# Altium footprint library connecteurs.PcbLib: 162 footprints (part 5 of 11)
Each footprint in its own frame and in the unit in brackets; x right, y up, seen from the top. Pads: shape width x height; smd on the part's side, far side on the other; paste and mask are expansions set on the pad; w line width, h text height; cw(c..) or ccw(c..) is an arc to the next point about the centre after c.
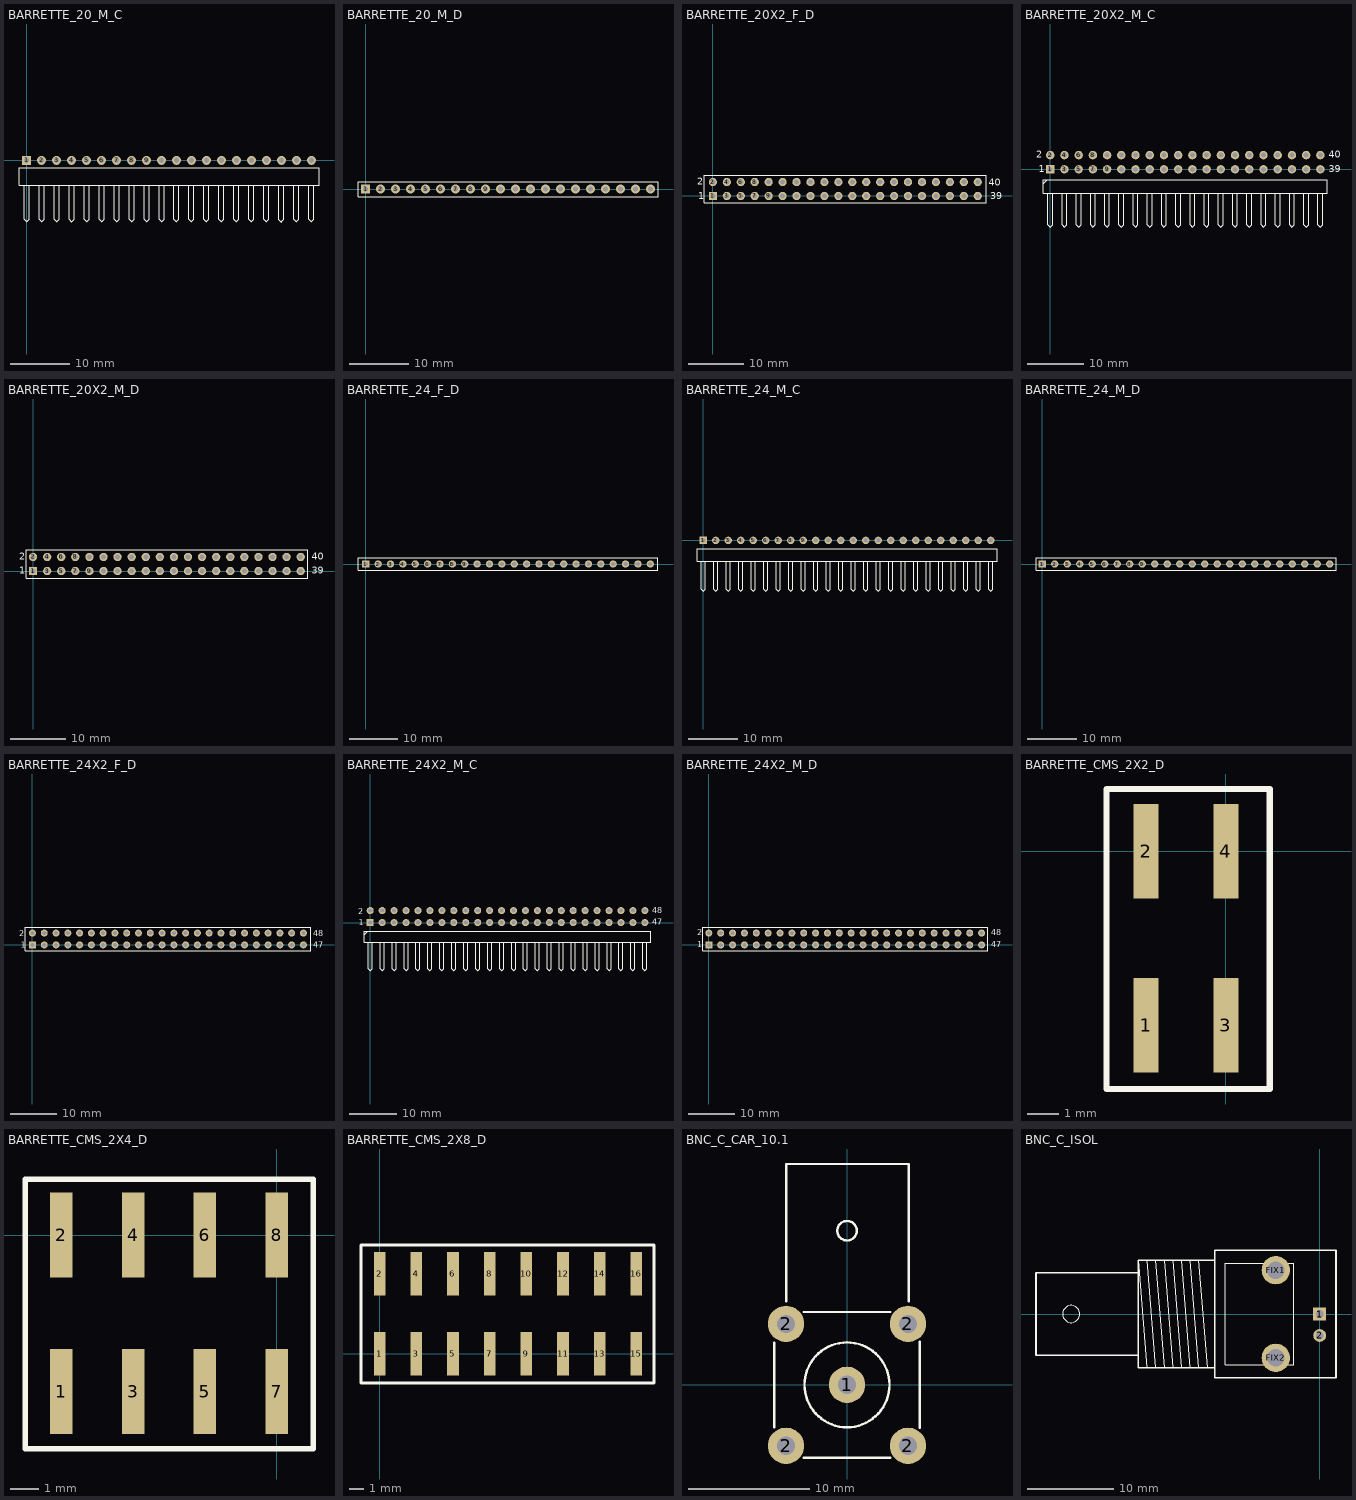
[diagram p4: the footprints below, top view; thin cyan lines are the x and y axes]

## BARRETTE_20_M_C [mm] "BARRETTE 20 CONTACTS ; 1 RANGEE ; COUDEE ; MALE ; ESPACEMENT BROCHES = 2.54 mm"
height 2.5
pads (20):
  rect 1.5x1.5 hole 0.9: 1(0,0)
  round 1.5 hole 0.9: 2(2.54,0) 3(5.08,0) 4(7.62,0) 5(10.16,0) 6(12.7,0) 7(15.24,0) 8(17.78,0) 9(20.32,0) 10(22.86,0) 11(25.4,0) 12(27.94,0) 13(30.48,0) 14(33.02,0) 15(35.56,0) 16(38.1,0) 17(40.64,0) 18(43.18,0) 19(45.72,0) 20(48.26,0)
Top Overlay:
  lines w0.2: -0.423,-4.19 -0.423,-10 0,-10.423 0.423,-10 0.423,-4.19 ; 2.117,-4.19 2.117,-9.99 2.54,-10.413 ; 2.54,-10.423 2.963,-10 2.963,-4.19 ; 4.657,-4.19 4.657,-10 5.08,-10.423 5.503,-10 5.503,-4.19 ; 7.197,-4.19 7.197,-10 7.62,-10.423 8.043,-10 8.043,-4.19 ; 9.737,-4.19 9.737,-10 10.16,-10.423 10.583,-10 10.583,-4.19 ; 12.277,-4.19 12.277,-10 12.7,-10.423 13.123,-10 13.123,-4.19 ; 14.817,-4.19 14.817,-10 15.24,-10.423 15.663,-10 15.663,-4.19 ; 17.357,-4.19 17.357,-10 17.78,-10.423 18.203,-10 18.203,-4.19 ; 19.897,-4.19 19.897,-10 20.32,-10.423 20.743,-10 20.743,-4.19 ; 22.437,-4.19 22.437,-10 22.86,-10.423 23.283,-10 23.283,-4.19 ; 24.977,-4.19 24.977,-10 25.4,-10.423 25.823,-10 25.823,-4.19 ; 27.517,-4.19 27.517,-10 27.94,-10.423 28.363,-10 28.363,-4.19 ; 30.057,-4.19 30.057,-10 30.48,-10.423 30.903,-10 30.903,-4.19 ; 32.597,-4.19 32.597,-10 33.02,-10.423 33.443,-10 33.443,-4.19 ; 35.137,-4.19 35.137,-10 35.56,-10.423 35.983,-10 35.983,-4.19 ; 37.677,-4.19 37.677,-10 38.1,-10.423 38.523,-10 38.523,-4.19 ; 40.217,-4.19 40.217,-10 40.64,-10.423 41.063,-10 41.063,-4.19 ; 42.757,-4.19 42.757,-10.01 43.18,-10.433 ; 43.18,-10.423 43.603,-10 43.603,-4.19 ; 45.297,-4.19 45.297,-10 45.72,-10.423 46.143,-10 46.143,-4.19 ; 47.837,-4.19 47.837,-10 48.26,-10.423 48.683,-10 48.683,-4.19 ; -1.27,-4.19 -1.27,-1.27 0.635,-1.27 49.53,-1.27 49.53,-4.19 -1.27,-4.19
3D body: height 2.55, standoff -1.95, extent -1.24,-10 11.46,0.32
3D body: height 2.55, standoff -1.95, extent 11.46,-10 24.16,0.32
3D body: height 2.55, standoff -1.95, extent 24.16,-10 36.86,0.32
3D body: height 2.55, standoff -1.95, extent 36.86,-10 49.56,0.32

## BARRETTE_20_M_D [mm] "BARRETTE 20 CONTACTS ; 1 RANGEE ; DROITE ; MALE ; ESPACEMENT BROCHES = 2.54 mm"
height 9.6
pads (20):
  rect 1.5x1.5 hole 0.9: 1(0,0)
  round 1.5 hole 0.9: 2(2.54,0) 3(5.08,0) 4(7.62,0) 5(10.16,0) 6(12.7,0) 7(15.24,0) 8(17.78,0) 9(20.32,0) 10(22.86,0) 11(25.4,0) 12(27.94,0) 13(30.48,0) 14(33.02,0) 15(35.56,0) 16(38.1,0) 17(40.64,0) 18(43.18,0) 19(45.72,0) 20(48.26,0)
Top Overlay:
  lines w0.2: -1.27,-1.27 -1.27,1.27 0.635,1.27 49.53,1.27 49.53,-1.27 -1.27,-1.27
3D body: height 10.1, standoff -1.5, extent -1.3,-1.27 49.5,1.27

## BARRETTE_20X2_F_D [mm] "BARRETTE 20 CONTACTS ; 2 RANGEES ; DROITE ; FEMELLE ; ESPACEMENT BROCHES = 2.54 mm"
height 8.6
pads (40):
  rect 1.5x1.5 hole 0.9: 1(0,0)
  round 1.5 hole 0.9: 2(0,2.54) 3(2.54,0) 4(2.54,2.54) 5(5.08,0) 6(5.08,2.54) 7(7.62,0) 8(7.62,2.54) 9(10.16,0) 10(10.16,2.54) 11(12.7,0) 12(12.7,2.54) 13(15.24,0) 14(15.24,2.54) 15(17.78,0) 16(17.78,2.54) 17(20.32,0) 18(20.32,2.54) 19(22.86,0) 20(22.86,2.54) 21(25.4,0) 22(25.4,2.54) 23(27.94,0) 24(27.94,2.54) 25(30.48,0) 26(30.48,2.54) 27(33.02,0) 28(33.02,2.54) 29(35.56,0) 30(35.56,2.54) 31(38.1,0) 32(38.1,2.54) 33(40.64,0) 34(40.64,2.54) 35(43.18,0) 36(43.18,2.54) 37(45.72,0) 38(45.72,2.54) 39(48.26,0) 40(48.26,2.54)
Top Overlay:
  lines w0.2: -1.6,-1.27 49.8,-1.27 49.8,3.81 -1.6,3.81 -1.6,-1.27
  text "1" at -2.7,-0.6 h1.27
  text "2" at -2.9,2 h1.27
  text "40" at 50.3,1.9 h1.27
  text "39" at 50.5,-0.6 h1.27
3D body: height 8.5, standoff -2.65, extent -1.554,-1.2 49.754,3.753

## BARRETTE_20X2_M_C [mm] "BARRETTE 20 CONTACTS ; 2 RANGEES ; COUDEE ; MALE ; ESPACEMENT BROCHES = 2.54 mm"
height 5
pads (40):
  rect 1.5x1.5 hole 0.9: 1(0,0)
  round 1.5 hole 0.9: 2(0,2.54) 3(2.54,0) 4(2.54,2.54) 5(5.08,0) 6(5.08,2.54) 7(7.62,0) 8(7.62,2.54) 9(10.16,0) 10(10.16,2.54) 11(12.7,0) 12(12.7,2.54) 13(15.24,0) 14(15.24,2.54) 15(17.78,0) 16(17.78,2.54) 17(20.32,0) 18(20.32,2.54) 19(22.86,0) 20(22.86,2.54) 21(25.4,0) 22(25.4,2.54) 23(27.94,0) 24(27.94,2.54) 25(30.48,0) 26(30.48,2.54) 27(33.02,0) 28(33.02,2.54) 29(35.56,0) 30(35.56,2.54) 31(38.1,0) 32(38.1,2.54) 33(40.64,0) 34(40.64,2.54) 35(43.18,0) 36(43.18,2.54) 37(45.72,0) 38(45.72,2.54) 39(48.26,0) 40(48.26,2.54)
Top Overlay:
  lines w0.2: -1.27,-2.605 -0.635,-1.97 ; -0.423,-4.3 -0.423,-9.9 0,-10.323 0.423,-9.9 0.423,-4.4 ; 2.117,-4.3 2.117,-9.9 2.54,-10.323 2.963,-9.9 2.963,-4.3 ; 4.657,-4.3 4.657,-9.9 5.08,-10.323 5.503,-9.9 5.503,-4.3 ; 7.197,-4.3 7.197,-9.9 7.62,-10.323 8.043,-9.9 8.043,-4.3 ; 9.737,-4.4 9.737,-9.9 10.16,-10.323 10.583,-9.9 10.583,-4.3 ; 12.277,-4.3 12.277,-9.9 12.7,-10.323 13.123,-9.9 13.123,-4.3 ; 14.817,-4.3 14.817,-9.9 15.24,-10.323 15.663,-9.9 15.663,-4.3 ; 17.357,-4.3 17.357,-9.9 17.78,-10.323 18.203,-9.9 18.203,-4.3 ; 19.897,-4.3 19.897,-9.9 20.32,-10.323 20.743,-9.9 20.743,-4.3 ; 22.437,-4.3 22.437,-9.9 22.86,-10.323 23.283,-9.9 23.283,-4.3 ; 24.977,-4.3 24.977,-9.9 25.4,-10.323 25.823,-9.9 25.823,-4.3 ; 27.517,-4.3 27.517,-9.9 27.94,-10.323 28.363,-9.9 28.363,-4.3 ; 30.057,-4.3 30.057,-9.9 30.48,-10.323 30.903,-9.9 30.903,-4.3 ; 32.597,-4.3 32.597,-9.9 33.02,-10.323 33.443,-9.9 33.443,-4.3 ; 35.137,-4.3 35.137,-9.9 35.56,-10.323 35.983,-9.9 35.983,-4.3 ; 37.677,-4.4 37.677,-9.9 38.1,-10.323 38.523,-9.9 38.523,-4.3 ; 40.217,-4.3 40.217,-9.9 40.64,-10.323 41.063,-9.9 41.063,-4.3 ; 42.757,-4.3 42.757,-9.9 43.18,-10.323 43.603,-9.9 43.603,-4.3 ; 45.297,-4.3 45.297,-9.9 45.72,-10.323 46.143,-9.9 46.143,-4.3 ; 47.837,-4.3 47.837,-9.9 48.26,-10.323 48.683,-9.9 48.683,-4.3 ; -1.27,-4.3 49.53,-4.3 49.53,-1.9 -1.27,-1.9 -1.27,-4.3
  text "2" at -2.54,2.032 h1.27
  text "1" at -2.032,-0.508 h1.27
  text "39" at 49.784,-0.508 h1.27
  text "40" at 49.784,2.032 h1.27
3D body: height 5.64, standoff -2.23, extent -1.3,-9.9 49.5,2.863

## BARRETTE_20X2_M_D [mm] "BARRETTE 20 CONTACTS ; 2 RANGEES ; DROITE ; MALE ; ESPACEMENT BROCHES = 2.54 mm"
height 9.6
pads (40):
  rect 1.5x1.5 hole 0.9: 1(0,0)
  round 1.5 hole 0.9: 2(0,2.54) 3(2.54,0) 4(2.54,2.54) 5(5.08,0) 6(5.08,2.54) 7(7.62,0) 8(7.62,2.54) 9(10.16,0) 10(10.16,2.54) 11(12.7,0) 12(12.7,2.54) 13(15.24,0) 14(15.24,2.54) 15(17.78,0) 16(17.78,2.54) 17(20.32,0) 18(20.32,2.54) 19(22.86,0) 20(22.86,2.54) 21(25.4,0) 22(25.4,2.54) 23(27.94,0) 24(27.94,2.54) 25(30.48,0) 26(30.48,2.54) 27(33.02,0) 28(33.02,2.54) 29(35.56,0) 30(35.56,2.54) 31(38.1,0) 32(38.1,2.54) 33(40.64,0) 34(40.64,2.54) 35(43.18,0) 36(43.18,2.54) 37(45.72,0) 38(45.72,2.54) 39(48.26,0) 40(48.26,2.54)
Top Overlay:
  lines w0.2: -1.27,-1.27 -1.27,3.81 49.53,3.81 49.53,-1.27 -1.27,-1.27
  text "39" at 50.292,-0.508 h1.27
  text "40" at 50.292,2.032 h1.27
  text "2" at -2.54,2.032 h1.27
  text "1" at -2.54,-0.508 h1.27
3D body: height 10.67, standoff -2.79, extent -1.3,-1.24 49.5,3.84

## BARRETTE_24_F_D [mm] "BARRETTE 24 CONTACTS ; 1 RANGEE ; DROITE ; FEMELLE ; ESPACEMENT BROCHES = 2.54 mm"
height 8.6
pads (24):
  rect 1.5x1.5 hole 0.9: 1(0,0)
  round 1.5 hole 0.9: 2(2.54,0) 3(5.08,0) 4(7.62,0) 5(10.16,0) 6(12.7,0) 7(15.24,0) 8(17.78,0) 9(20.32,0) 10(22.86,0) 11(25.4,0) 12(27.94,0) 13(30.48,0) 14(33.02,0) 15(35.56,0) 16(38.1,0) 17(40.64,0) 18(43.18,0) 19(45.72,0) 20(48.26,0) 21(50.8,0) 22(53.34,0) 23(55.88,0) 24(58.42,0)
Top Overlay:
  lines w0.2: -1.6,-1.27 60,-1.27 60,1.27 0.635,1.27 -1.6,1.27 -1.6,-1.27
3D body: height 8.5, standoff -2.65, extent -1.534,-1.213 59.934,1.2

## BARRETTE_24_M_C [mm] "BARRETTE 24 CONTACTS ; 1 RANGEE ; COUDEE ; MALE ; ESPACEMENT BROCHES = 2.54 mm"
height 2.5
pads (24):
  rect 1.5x1.5 hole 0.9: 1(0,0)
  round 1.5 hole 0.9: 2(2.54,0) 3(5.08,0) 4(7.62,0) 5(10.16,0) 6(12.7,0) 7(15.24,0) 8(17.78,0) 9(20.32,0) 10(22.86,0) 11(25.4,0) 12(27.94,0) 13(30.48,0) 14(33.02,0) 15(35.56,0) 16(38.1,0) 17(40.64,0) 18(43.18,0) 19(45.72,0) 20(48.26,0) 21(50.8,0) 22(53.34,0) 23(55.88,0) 24(58.42,0)
Top Overlay:
  lines w0.2: -0.423,-4.2 -0.423,-9.92 0,-10.343 0.423,-9.92 0.423,-4.2 ; 2.117,-4.2 2.117,-9.92 2.54,-10.343 2.963,-9.92 2.963,-4.2 ; 4.657,-4.2 4.657,-9.92 5.08,-10.343 ; 5.08,-10.353 5.503,-9.93 5.503,-4.2 ; 7.197,-4.2 7.197,-9.92 7.62,-10.343 8.043,-9.92 8.043,-4.2 ; 9.737,-4.2 9.737,-9.92 10.16,-10.343 10.583,-9.92 10.583,-4.2 ; 12.277,-4.2 12.277,-9.92 12.7,-10.343 13.123,-9.92 13.123,-4.3 ; 14.817,-4.2 14.817,-9.92 15.24,-10.343 15.663,-9.92 15.663,-4.2 ; 17.357,-4.2 17.357,-9.92 17.78,-10.343 18.203,-9.92 18.203,-4.2 ; 19.897,-4.2 19.897,-9.92 20.32,-10.343 20.743,-9.92 20.743,-4.2 ; 22.443,-4.2 22.443,-9.92 22.867,-10.343 ; 22.86,-10.343 23.283,-9.92 23.283,-4.2 ; 24.977,-4.2 24.977,-9.92 25.4,-10.343 25.823,-9.92 25.823,-4.2 ; 27.5,-4.2 27.5,-9.92 27.923,-10.343 ; 27.94,-10.343 28.363,-9.92 28.363,-4.2 ; 30.043,-4.2 30.043,-9.92 30.467,-10.343 ; 30.48,-10.343 30.903,-9.92 30.903,-4.2 ; 32.597,-4.2 32.597,-9.92 33.02,-10.343 33.443,-9.92 33.443,-4.2 ; 35.137,-4.2 35.137,-9.92 35.56,-10.343 35.983,-9.92 35.983,-4.2 ; 37.677,-4.2 37.677,-9.92 38.1,-10.343 38.523,-9.92 38.523,-4.2 ; 40.217,-4.2 40.217,-9.92 40.64,-10.343 41.063,-9.92 41.063,-4.2 ; 42.757,-4.2 42.757,-9.92 43.18,-10.343 43.603,-9.92 43.603,-4.2 ; 45.297,-4.2 45.297,-9.92 45.72,-10.343 46.143,-9.92 46.143,-4.2 ; 47.843,-4.2 47.843,-9.92 48.267,-10.343 ; 48.26,-10.343 48.683,-9.92 48.683,-4.2 ; 50.377,-4.2 50.377,-9.92 50.8,-10.343 51.223,-9.92 51.223,-4.2 ; 52.917,-4.2 52.917,-9.92 53.34,-10.343 53.763,-9.92 53.763,-4.2 ; 55.443,-4.2 55.443,-9.92 55.867,-10.343 ; 55.88,-10.343 56.303,-9.92 56.303,-4.2 ; 58,-4.2 58,-9.92 58.423,-10.343 ; 58.42,-10.343 58.843,-9.92 58.843,-4.2 ; -1.27,-4.2 -1.27,-1.7 1.465,-1.7 59.69,-1.7 59.69,-4.2 -1.27,-4.2
3D body: height 3.07, standoff -2.26, extent -1.28,-9.924 59.68,0.3

## BARRETTE_24_M_D [mm] "BARRETTE 24 CONTACTS ; 1 RANGEE ; DROITE ; MALE ; ESPACEMENT BROCHES = 2.54 mm"
height 9.6
pads (24):
  rect 1.5x1.5 hole 0.9: 1(0,0)
  round 1.5 hole 0.9: 2(2.54,0) 3(5.08,0) 4(7.62,0) 5(10.16,0) 6(12.7,0) 7(15.24,0) 8(17.78,0) 9(20.32,0) 10(22.86,0) 11(25.4,0) 12(27.94,0) 13(30.48,0) 14(33.02,0) 15(35.56,0) 16(38.1,0) 17(40.64,0) 18(43.18,0) 19(45.72,0) 20(48.26,0) 21(50.8,0) 22(53.34,0) 23(55.88,0) 24(58.42,0)
Top Overlay:
  lines w0.2: -1.27,-1.27 59.69,-1.27 59.69,1.27 0.635,1.27 -1.27,1.27 -1.27,-1.27
3D body: height 10.67, standoff -2.79, extent -1.3,-1.27 59.66,1.27

## BARRETTE_24X2_F_D [mm] "BARRETTE 24 CONTACTS ; 2 RANGEES ; DROITE ; FEMELLE ; ESPACEMENT BROCHES = 2.54 mm"
height 8.6
pads (48):
  rect 1.5x1.5 hole 0.9: 1(0,0)
  round 1.5 hole 0.9: 2(0,2.54) 3(2.54,0) 4(2.54,2.54) 5(5.08,0) 6(5.08,2.54) 7(7.62,0) 8(7.62,2.54) 9(10.16,0) 10(10.16,2.54) 11(12.7,0) 12(12.7,2.54) 13(15.24,0) 14(15.24,2.54) 15(17.78,0) 16(17.78,2.54) 17(20.32,0) 18(20.32,2.54) 19(22.86,0) 20(22.86,2.54) 21(25.4,0) 22(25.4,2.54) 23(27.94,0) 24(27.94,2.54) 25(30.48,0) 26(30.48,2.54) 27(33.02,0) 28(33.02,2.54) 29(35.56,0) 30(35.56,2.54) 31(38.1,0) 32(38.1,2.54) 33(40.64,0) 34(40.64,2.54) 35(43.18,0) 36(43.18,2.54) 37(45.72,0) 38(45.72,2.54) 39(48.26,0) 40(48.26,2.54) 41(50.8,0) 42(50.8,2.54) 43(53.34,0) 44(53.34,2.54) 45(55.88,0) 46(55.88,2.54) 47(58.42,0) 48(58.42,2.54)
Top Overlay:
  lines w0.2: -1.6,-1.27 60,-1.27 60,3.81 -1.6,3.81 -1.6,-1.27
  text "2" at -2.9,1.9 h1.27
  text "1" at -2.5,-0.6 h1.27
  text "48" at 60.5,1.9 h1.27
  text "47" at 60.5,-0.6 h1.27
3D body: height 8.5, standoff -2.65, extent -1.534,-1.2 59.934,3.753

## BARRETTE_24X2_M_C [mm] "BARRETTE 24 CONTACTS ; 2 RANGEES ; COUDEE ; MALE ; ESPACEMENT BROCHES = 2.54 mm"
height 5
pads (48):
  rect 1.5x1.5 hole 0.9: 1(0,0)
  round 1.5 hole 0.9: 2(0,2.54) 3(2.54,0) 4(2.54,2.54) 5(5.08,0) 6(5.08,2.54) 7(7.62,0) 8(7.62,2.54) 9(10.16,0) 10(10.16,2.54) 11(12.7,0) 12(12.7,2.54) 13(15.24,0) 14(15.24,2.54) 15(17.78,0) 16(17.78,2.54) 17(20.32,0) 18(20.32,2.54) 19(22.86,0) 20(22.86,2.54) 21(25.4,0) 22(25.4,2.54) 23(27.94,0) 24(27.94,2.54) 25(30.48,0) 26(30.48,2.54) 27(33.02,0) 28(33.02,2.54) 29(35.56,0) 30(35.56,2.54) 31(38.1,0) 32(38.1,2.54) 33(40.64,0) 34(40.64,2.54) 35(43.18,0) 36(43.18,2.54) 37(45.72,0) 38(45.72,2.54) 39(48.26,0) 40(48.26,2.54) 41(50.8,0) 42(50.8,2.54) 43(53.34,0) 44(53.34,2.54) 45(55.88,0) 46(55.88,2.54) 47(58.42,0) 48(58.42,2.54)
Top Overlay:
  lines w0.2: -1.27,-2.605 -0.635,-1.97 ; -0.423,-4.2 -0.423,-9.86 0,-10.283 0.423,-9.86 0.423,-4.2 ; 2.117,-4.2 2.117,-9.86 2.54,-10.283 2.963,-9.86 2.963,-4.2 ; 4.657,-4.2 4.657,-9.86 5.08,-10.283 5.503,-9.86 5.503,-4.2 ; 7.197,-4.2 7.197,-9.86 7.62,-10.283 8.043,-9.86 8.043,-4.2 ; 9.737,-4.3 9.737,-9.86 10.16,-10.283 10.583,-9.86 10.583,-4.2 ; 12.277,-4.2 12.277,-9.86 12.7,-10.283 ; 12.7,-10.293 13.123,-9.87 13.123,-4.2 ; 14.817,-4.2 14.817,-9.86 15.24,-10.283 15.663,-9.86 15.663,-4.3 ; 17.357,-4.2 17.357,-9.86 17.78,-10.283 18.203,-9.86 18.203,-4.2 ; 19.897,-4.2 19.897,-9.86 20.32,-10.283 20.743,-9.86 20.743,-4.2 ; 22.437,-4.2 22.437,-9.86 22.86,-10.283 23.283,-9.86 23.283,-4.2 ; 24.977,-4.2 24.977,-9.86 25.4,-10.283 25.823,-9.86 25.823,-4.2 ; 27.517,-4.2 27.517,-9.86 27.94,-10.283 28.363,-9.86 28.363,-4.2 ; 30.057,-4.2 30.057,-9.86 30.48,-10.283 30.903,-9.86 30.903,-4.2 ; 32.597,-4.2 32.597,-9.86 33.02,-10.283 33.443,-9.86 33.443,-4.2 ; 35.137,-4.2 35.137,-9.86 35.56,-10.283 35.983,-9.86 35.983,-4.2 ; 37.677,-4.2 37.677,-9.86 38.1,-10.283 38.523,-9.86 38.523,-4.2 ; 40.217,-4.2 40.217,-9.86 40.64,-10.283 41.063,-9.86 41.063,-4.2 ; 42.757,-4.2 42.757,-9.86 43.18,-10.283 43.603,-9.86 43.603,-4.2 ; 45.297,-4.2 45.297,-9.86 45.72,-10.283 46.143,-9.86 46.143,-4.2 ; 47.837,-4.2 47.837,-9.85 48.26,-10.273 ; 48.26,-10.283 48.683,-9.86 48.683,-4.2 ; 50.377,-4.2 50.377,-9.86 50.8,-10.283 51.223,-9.86 51.223,-4.2 ; 52.917,-4.2 52.917,-9.86 53.34,-10.283 53.763,-9.86 53.763,-4.2 ; 55.457,-4.2 55.457,-9.86 55.88,-10.283 56.303,-9.86 56.303,-4.2 ; 57.983,-9.86 58.407,-10.283 ; 57.997,-9.86 57.997,-4.2 ; 58.42,-10.283 58.843,-9.86 58.843,-4.3 ; -1.27,-4.2 59.69,-4.2 59.69,-1.9 -1.27,-1.9 -1.27,-4.2
  text "2" at -2.6,1.8 h1.27
  text "1" at -2.4,-0.6 h1.27
  text "47" at 59.944,-0.508 h1.27
  text "48" at 59.944,2.032 h1.27
3D body: height 5.64, standoff -2.23, extent -1.28,-9.864 59.68,2.9

## BARRETTE_24X2_M_D [mm] "BARRETTE 24 CONTACTS ; 2 RANGEES ; DROITE ; MALE ; ESPACEMENT BROCHES = 2.54 mm"
height 9.6
pads (48):
  rect 1.5x1.5 hole 0.9: 1(0,0)
  round 1.5 hole 0.9: 2(0,2.54) 3(2.54,0) 4(2.54,2.54) 5(5.08,0) 6(5.08,2.54) 7(7.62,0) 8(7.62,2.54) 9(10.16,0) 10(10.16,2.54) 11(12.7,0) 12(12.7,2.54) 13(15.24,0) 14(15.24,2.54) 15(17.78,0) 16(17.78,2.54) 17(20.32,0) 18(20.32,2.54) 19(22.86,0) 20(22.86,2.54) 21(25.4,0) 22(25.4,2.54) 23(27.94,0) 24(27.94,2.54) 25(30.48,0) 26(30.48,2.54) 27(33.02,0) 28(33.02,2.54) 29(35.56,0) 30(35.56,2.54) 31(38.1,0) 32(38.1,2.54) 33(40.64,0) 34(40.64,2.54) 35(43.18,0) 36(43.18,2.54) 37(45.72,0) 38(45.72,2.54) 39(48.26,0) 40(48.26,2.54) 41(50.8,0) 42(50.8,2.54) 43(53.34,0) 44(53.34,2.54) 45(55.88,0) 46(55.88,2.54) 47(58.42,0) 48(58.42,2.54)
Top Overlay:
  lines w0.2: -1.27,-1.27 59.69,-1.27 59.69,3.81 -1.27,3.81 -1.27,-1.27
  text "2" at -2.54,2.032 h1.27
  text "1" at -2.54,-0.508 h1.27
  text "48" at 60.452,2.032 h1.27
  text "47" at 60.452,-0.508 h1.27
3D body: height 10.67, standoff -2.79, extent -1.3,-1.24 59.66,3.84

## BARRETTE_CMS_2X2_D [mm] "BARRETTE CMS 2 CONTACTS ; 2 RANGEES ; DROITE ; MALE ; ESPACEMENT BROCHES = 2.54mm / 5.58mm"
height 10
pads (4):
  rect 0.8x3 smd: 1(-2.54,-5.54) 2(-2.54,0) 3(0,-5.54) 4(0,0)
Top Overlay:
  lines w0.2: -3.8,-7.568 -3.8,1.98 0,1.98 1.4,1.98 1.4,-7.568 -3.8,-7.568
3D body: height 9.66, standoff 0.01, extent -3.78,-6.583 1.3,0.783

## BARRETTE_CMS_2X4_D [mm] "BARRETTE CMS 4 CONTACTS ; 2 RANGEES ; DROITE ; MALE ; ESPACEMENT BROCHES = 2.54mm / 5.58mm"
height 10
pads (8):
  rect 0.8x3 smd: 1(-7.62,-5.54) 2(-7.62,0) 3(-5.08,-5.54) 4(-5.08,0) 5(-2.54,-5.54) 6(-2.54,0) 7(0,-5.54) 8(0,0)
Top Overlay:
  lines w0.2: -8.9,-7.568 1.3,-7.568 1.3,1.98 -5.08,1.98 -8.9,1.98 -8.9,-7.568
3D body: height 9.66, standoff 0.01, extent -8.88,-6.5 1.28,0.866

## BARRETTE_CMS_2X8_D [mm] "BARRETTE CMS 8 CONTACTS ; 2 RANGEES ; DROITE ; MALE ; ESPACEMENT BROCHES = 2.54mm / 5.58mm"
height 10
pads (16):
  rect 0.8x3 smd: 1(0,0) 2(0,5.54) 3(2.54,0) 4(2.54,5.54) 5(5.08,0) 6(5.08,5.54) 7(7.62,0) 8(7.62,5.54) 9(10.16,0) 10(10.16,5.54) 11(12.7,0) 12(12.7,5.54) 13(15.24,0) 14(15.24,5.54) 15(17.78,0) 16(17.78,5.54)
Top Overlay:
  lines w0.2: -1.3,-2.028 -1.3,7.52 2.54,7.52 19,7.52 19,-2.028 -1.3,-2.028
3D body: height 9.66, standoff 0.01, extent -1.26,-0.9 19.06,6.466

## BNC_C_CAR_10.1 [mm] "EMBASE BNC CARREE ;  COUDEE ; 50R ; DIAMETRE = 9.7 mm ; ESPACEMENT BROCHES GND = 10.1 mm"
height 19.75
pads (5):
  round 3 hole 1.5: 1(0,0) 2(-5.025,-5.025) 2(-5.025,5.025) 2(5.025,-5.025) 2(5.025,5.025)
Top Overlay:
  circle w0.2: c0,12.7 r0.803
  circle w0.2: c0,0 r3.5
  lines w0.2: -6,-3.5 -6,3.485 ; -5,6.9 -5,18.2 5.08,18.2 5.08,6.9 ; -3.556,-6 3.556,-6 ; -3.556,6 3.556,6 ; 6,-3.556 6,3.556
3D body: height 18.65, standoff -4, extent -5.5,-5.6 5.5,16.8

## BNC_C_ISOL [mm] "EMBASE BNC CARREE; ISOLEE ;  COUDEE ; 50R ; DIAMETRE = 9.7 mm"
height 14.7
pads (4):
  rect 1.5x1.5 hole 0.9: 1(0,0)
  round 1.5 hole 0.9: 2(0,-2.5)
  round 3.3 hole 2: FIX1(-5.1,5.1) FIX2(-5.1,-5.1)
Top Overlay:
  circle w0.025: c-28.9,0 r1
  lines w0.025: -20.1,-6.25 -21.1,6.25 ; -20.1,6.25 -19.1,-6.25 ; -19.1,6.25 -18.1,-6.25 ; -18.1,6.25 -17.1,-6.25 ; -17.1,6.25 -16.1,-6.25 ; -16.1,6.25 -15.1,-6.25 ; -15.1,6.25 -14.1,-6.25 ; -14.1,6.25 -13.1,-6.25 ; -21.1,-4.8 -21.1,-6.25 -12.2,-6.25 ; -21.1,-4.8 -21.1,4.8 ; -21.1,-4.8 -33,-4.8 -33,4.8 -21.1,4.8 ; -21.1,4.8 -21.1,6.25 ; -21.1,6.25 -12.2,6.25 ; -12.2,-6.25 -12.2,-7.4 1.9,-7.4 1.9,7.4 -12.2,7.4 -12.2,6.25 ; -12.2,-6.25 -12.2,6.25 ; -11,-5.9 -11,5.9 -3,5.9 -3,-5.9 -11,-5.9
  lines w0.2: -21.1,-4.8 -21.1,-6.25 -12.2,-6.25 ; -21.1,-4.8 -33,-4.8 -33,4.8 -21.1,4.8 ; -21.1,-4.8 -21.1,4.8 ; -21.1,4.8 -21.1,6.25 -12.2,6.25 ; -12.2,-6.25 -12.2,-7.4 1.9,-7.4 1.9,7.4 -12.2,7.4 -12.2,6.25 ; -12.2,-6.25 -12.2,6.25
3D body: height 3.7, standoff -16.3, extent -33.95,-7.38 1.8,7.38